# Altium footprint library ICs And Semiconductors SMD.PcbLib: 602 footprints (part 13 of 38)
Each footprint in its own frame and in the unit in brackets; x right, y up, seen from the top. Pads: shape width x height; smd on the part's side, far side on the other; paste and mask are expansions set on the pad; w line width, h text height; cw(c..) or ccw(c..) is an arc to the next point about the centre after c.
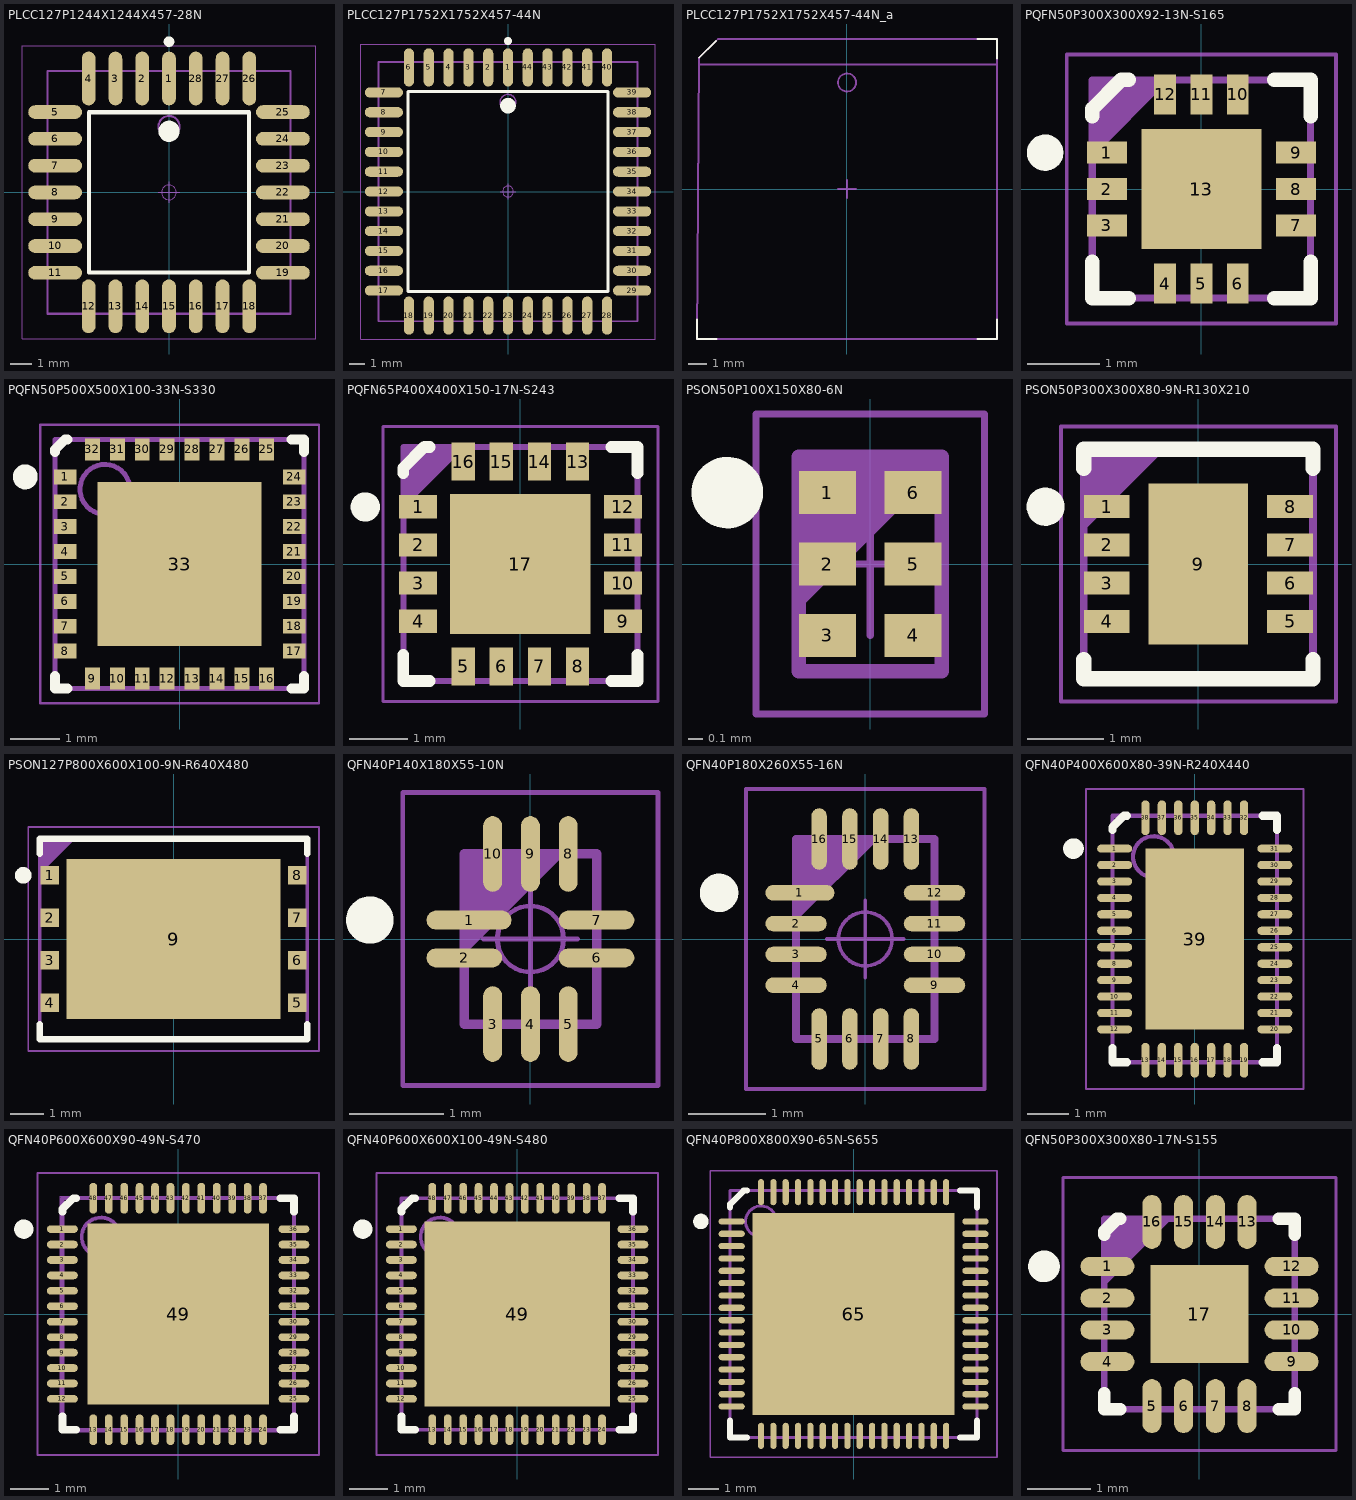
[diagram p12: the footprints below, top view; thin cyan lines are the x and y axes]

## PLCC127P1244X1244X457-28N [mm] "PLCC, 1.27mm Pitch, Square; 7 Pin X 7 Pin, 11.50mm L X 11.50mm W X 4.57mm H body, IPC Medium Density"
height 4.57
pads (28):
  oval 0.65x2.55 smd: 1(0,5.4) 2(-1.27,5.4) 3(-2.54,5.4) 4(-3.81,5.4) 12(-3.81,-5.4) 13(-2.54,-5.4) 14(-1.27,-5.4) 15(0,-5.4) 16(1.27,-5.4) 17(2.54,-5.4) 18(3.81,-5.4) 26(3.81,5.4) 27(2.54,5.4) 28(1.27,5.4)
  oval 2.55x0.65 smd: 5(-5.4,3.81) 6(-5.4,2.54) 7(-5.4,1.27) 8(-5.4,0) 9(-5.4,-1.27) 10(-5.4,-2.54) 11(-5.4,-3.81) 19(5.4,-3.81) 20(5.4,-2.54) 21(5.4,-1.27) 22(5.4,0) 23(5.4,1.27) 24(5.4,2.54) 25(5.4,3.81)
Top Overlay:
  circle w0.5: c0,2.9 r0.25
  circle w0.25: c0,7.15 r0.125
  lines w0.2: -3.8,-3.8 -3.8,3.8 3.8,3.8 3.8,-3.8 -3.8,-3.8
Mechanical 14:
  circle w0.1: c0,3.125 r0.5
  lines w0.1: -5.752,-5.752 -5.752,5.752 5.752,5.752 5.752,-5.752 -5.752,-5.752
Mechanical 15:
  circle w0.05: c0,0 r0.35
  lines w0.05: -0.5,0 0.5,0 ; 0,-0.5 0,0.5 ; -6.95,-6.95 -6.95,6.95 6.95,6.95 6.95,-6.95 -6.95,-6.95
3D body "PLCC127P1244X1244X457-28N.stp": height 4.5, standoff 0, extent -6.159,-6.157 6.16,6.162

## PLCC127P1752X1752X457-44N [mm] "PLCC, 1.27mm Pitch, Square; 44 Pin, 16.60mm L X 16.60mm W X 4.57mm H Body, IPC Medium Density"
height 4.57
pads (44):
  oval 0.65x2.45 smd: 1(0,7.95) 2(-1.27,7.95) 3(-2.54,7.95) 4(-3.81,7.95) 5(-5.08,7.95) 6(-6.35,7.95) 18(-6.35,-7.95) 19(-5.08,-7.95) 20(-3.81,-7.95) 21(-2.54,-7.95) 22(-1.27,-7.95) 23(0,-7.95) 24(1.27,-7.95) 25(2.54,-7.95) 26(3.81,-7.95) 27(5.08,-7.95) 28(6.35,-7.95) 40(6.35,7.95) 41(5.08,7.95) 42(3.81,7.95) 43(2.54,7.95) 44(1.27,7.95)
  oval 2.45x0.65 smd: 7(-7.95,6.35) 8(-7.95,5.08) 9(-7.95,3.81) 10(-7.95,2.54) 11(-7.95,1.27) 12(-7.95,0) 13(-7.95,-1.27) 14(-7.95,-2.54) 15(-7.95,-3.81) 16(-7.95,-5.08) 17(-7.95,-6.35) 29(7.95,-6.35) 30(7.95,-5.08) 31(7.95,-3.81) 32(7.95,-2.54) 33(7.95,-1.27) 34(7.95,0) 35(7.95,1.27) 36(7.95,2.54) 37(7.95,3.81) 38(7.95,5.08) 39(7.95,6.35)
Top Overlay:
  circle w0.25: c0,9.65 r0.125
  circle w0.5: c0,5.5 r0.25
  lines w0.2: -6.4,-6.4 6.4,-6.4 6.4,6.4 -6.4,6.4 -6.4,-6.4
Mechanical 14:
  circle w0.1: c0,5.725 r0.5
  lines w0.1: -8.3,-8.3 8.3,-8.3 8.3,8.3 -8.3,8.3 -8.3,-8.3
Mechanical 15:
  circle w0.05: c0,0 r0.35
  lines w0.05: -0.5,0 0.5,0 ; 0,-0.5 0,0.5 ; -9.45,-9.45 9.45,-9.45 9.45,9.45 -9.45,9.45 -9.45,-9.45
3D body "PLCC127P1752X1752X457-44N.stp": height 4.39, standoff 0, extent -8.762,-8.762 8.763,8.763

## PLCC127P1752X1752X457-44N_a [mm] "PLCC, 1.27mm Pitch, Square; 44 Pin, 16.60mm L X 16.60mm W X 4.57mm H Body, IPC Medium Density"
height 4.57
Top Overlay:
  lines w0.1: -8.3,-7.219 -8.3,-8.3 -7.219,-8.3 ; -8.188,7.261 -7.256,8.182 ; 7.219,-8.3 8.3,-8.3 8.3,-7.219 ; 7.219,8.3 8.3,8.3 8.3,7.219
Mechanical 8:
  lines w0.1: -0.5,0 0,0 ; 0,-0.5 0,0 ; 0,0.5 0,0 ; 0.5,0 0,0
Mechanical 14:
  circle w0.1: c0,5.893 r0.5
  lines w0.1: -8.191,6.893 8.3,6.893 ; -8.3,-8.3 -8.188,7.261 -7.136,8.3 8.3,8.3 8.3,-8.3 -8.3,-8.3
3D body "PLCC127P1752X1752X457-44N.stp": height 4.39, standoff 0, extent -8.762,-8.762 8.763,8.763

## PQFN50P300X300X92-13N-S165 [mm] "QFN, 0.50mm pitch,square; 12 Pin, 3mm X 3mm X 0.92mm H body (With Pullback Leads,Thermal Tab 1.65 X 1.65mm),  IPC Medium Density"
height 0.92
pads (13):
  rect 0.55x0.3 smd: 1(-1.3,0.5) 2(-1.3,0) 3(-1.3,-0.5) 7(1.3,-0.5) 8(1.3,0) 9(1.3,0.5)
  rect 0.3x0.55 smd: 4(-0.5,-1.3) 5(0,-1.3) 6(0.5,-1.3) 10(0.5,1.3) 11(0,1.3) 12(-0.5,1.3)
  rect 1.65x1.65 smd: 13(0,0)
Top Overlay:
  circle w0.25: c-2.15,0.5 r0.125
  lines w0.2: -1.5,-1 -1.5,-1.5 -1,-1.5 ; -1.5,1 -1.5,1.1 -1.1,1.5 -1,1.5 ; 1,-1.5 1.5,-1.5 1.5,-1 ; 1,1.5 1.5,1.5 1.5,1
Mechanical 14:
  lines w0.1: -1.5,0.5 -0.5,1.5 ; -1.5,0.6 -0.6,1.5 ; -1.5,0.7 -0.7,1.5 ; -1.5,0.8 -0.8,1.5 ; -1.5,0.9 -0.9,1.5 ; -1.5,1 -1,1.5 ; -1.5,1.1 -1.1,1.5 ; -1.5,1.2 -1.2,1.5 ; -1.5,1.3 -1.3,1.5 ; -1.5,1.4 -1.4,1.5 ; -1.5,-1.5 -1.5,1.5 1.5,1.5 1.5,-1.5 -1.5,-1.5
Mechanical 15:
  circle w0.05: c0,0 r0.35
  lines w0.05: -0.5,0 0.5,0 ; 0,-0.5 0,0.5 ; -1.85,-1.85 -1.85,1.85 1.85,1.85 1.85,-1.85 -1.85,-1.85
3D body "PQFN50P300X300X92-13N-S165.stp": height 0.92, standoff 0, extent -1.565,-1.565 1.565,1.565

## PQFN50P500X500X100-33N-S330 [mm] "QFN, 0.50mm pitch, Square; 32 Pin, 5.00mm L X 5.00mm W X 1.00mm H body (w/Pullback Leads, Thermal Tab 3.3 X 3.3mm),  IPC Medium Density"
height 1
pads (33):
  rect 0.45x0.3 smd: 1(-2.3,1.75) 2(-2.3,1.25) 3(-2.3,0.75) 4(-2.3,0.25) 5(-2.3,-0.25) 6(-2.3,-0.75) 7(-2.3,-1.25) 8(-2.3,-1.75) 17(2.3,-1.75) 18(2.3,-1.25) 19(2.3,-0.75) 20(2.3,-0.25) 21(2.3,0.25) 22(2.3,0.75) 23(2.3,1.25) 24(2.3,1.75)
  rect 0.3x0.45 smd: 9(-1.75,-2.3) 10(-1.25,-2.3) 11(-0.75,-2.3) 12(-0.25,-2.3) 13(0.25,-2.3) 14(0.75,-2.3) 15(1.25,-2.3) 16(1.75,-2.3) 25(1.75,2.3) 26(1.25,2.3) 27(0.75,2.3) 28(0.25,2.3) 29(-0.25,2.3) 30(-0.75,2.3) 31(-1.25,2.3) 32(-1.75,2.3)
  rect 3.3x3.3 smd: 33(0,0)
Top Overlay:
  circle w0.25: c-3.1,1.75 r0.125
  lines w0.2: -2.5,-2.25 -2.5,-2.5 -2.25,-2.5 ; -2.5,2.25 -2.5,2.3 -2.3,2.5 -2.25,2.5 ; 2.25,-2.5 2.5,-2.5 2.5,-2.25 ; 2.25,2.5 2.5,2.5 2.5,2.25
Mechanical 14:
  circle w0.1: c-1.5,1.5 r0.5
  lines w0.1: -2.5,-2.5 -2.5,2.5 2.5,2.5 2.5,-2.5 -2.5,-2.5
Mechanical 15:
  circle w0.05: c0,0 r0.35
  lines w0.05: -0.5,0 0.5,0 ; 0,-0.5 0,0.5 ; -2.8,-2.8 -2.8,2.8 2.8,2.8 2.8,-2.8 -2.8,-2.8
3D body "PQFN50P500X500X100-33N-S330.stp": height 1, standoff 0, extent -2.5,-2.5 2.5,2.5

## PQFN65P400X400X150-17N-S243 [mm] "QFN, 0.65mm Pitch, Square; 16 Pin, 4.00mm L X 4.00mm W X 1.50mm H Body (With Pullback Leads,Thermal Tab 2.43 X 2.43mm),  IPC Medium Density"
height 1.5
pads (17):
  rect 0.65x0.4 smd: 1(-1.75,0.975) 2(-1.75,0.325) 3(-1.75,-0.325) 4(-1.75,-0.975) 9(1.75,-0.975) 10(1.75,-0.325) 11(1.75,0.325) 12(1.75,0.975)
  rect 0.4x0.65 smd: 5(-0.975,-1.75) 6(-0.325,-1.75) 7(0.325,-1.75) 8(0.975,-1.75) 13(0.975,1.75) 14(0.325,1.75) 15(-0.325,1.75) 16(-0.975,1.75)
  rect 2.4x2.4 smd: 17(0,0)
Top Overlay:
  circle w0.25: c-2.65,0.975 r0.125
  lines w0.2: -2,-1.55 -2,-2 -1.55,-2 ; -2,1.55 -2,1.64 -1.64,2 -1.55,2 ; 1.55,-2 2,-2 2,-1.55 ; 1.55,2 2,2 2,1.55
Mechanical 14:
  lines w0.1: -2,1 -1,2 ; -2,1.1 -1.1,2 ; -2,1.2 -1.2,2 ; -2,1.3 -1.3,2 ; -2,1.4 -1.4,2 ; -2,1.5 -1.5,2 ; -2,1.6 -1.6,2 ; -2,1.7 -1.7,2 ; -2,1.8 -1.8,2 ; -2,1.9 -1.9,2 ; -2,-2 -2,2 2,2 2,-2 -2,-2
Mechanical 15:
  circle w0.05: c0,0 r0.35
  lines w0.05: -0.5,0 0.5,0 ; 0,-0.5 0,0.5 ; -2.35,-2.35 -2.35,2.35 2.35,2.35 2.35,-2.35 -2.35,-2.35
3D body "PQFN65P400X400X150-17N-S243.stp": height 1.45, standoff -0.05, extent -2,-2 2,2

## PSON50P100X150X80-6N [mm] "SON, 0.50mm,pitch; 6 pin,1.00mm W X 1.50mm L X 0.80mm H body (w/pullback leads),  IPC Medium Density"
height 0.8
pads (6):
  rect 0.4x0.3 smd: 1(-0.3,0.5) 2(-0.3,0) 3(-0.3,-0.5) 4(0.3,-0.5) 5(0.3,0) 6(0.3,0.5)
Top Overlay:
  circle w0.25: c-1,0.5 r0.125
Mechanical 14:
  lines w0.1: -0.5,-0.25 0.5,0.75 ; -0.5,-0.15 0.4,0.75 ; -0.5,-0.05 0.3,0.75 ; -0.5,0.05 0.2,0.75 ; -0.5,0.15 0.1,0.75 ; -0.5,0.25 0,0.75 ; -0.5,0.35 -0.1,0.75 ; -0.5,0.45 -0.2,0.75 ; -0.5,0.55 -0.3,0.75 ; -0.5,0.65 -0.4,0.75 ; 0.5,0.75 0.5,-0.75 -0.5,-0.75 -0.5,0.75 0.5,0.75
Mechanical 15:
  lines w0.05: -0.5,0 0.5,0 ; 0,-0.5 0,0.5 ; -0.8,-1.05 0.8,-1.05 0.8,1.05 -0.8,1.05 -0.8,-1.05
3D body "PSON50P100X150X80-6N.stp": height 0.8, standoff 0, extent -0.5,-0.75 0.5,0.75

## PSON50P300X300X80-9N-R130X210 [mm] "SON,  0.50mm pitch, 10 pin, 3mm X 3mm X 0.8mm H body (w/thermal tab 1.3 X 2.1mm),  IPC Medium Density"
height 0.8
pads (9):
  rect 0.6x0.3 smd: 1(-1.2,0.75) 2(-1.2,0.25) 3(-1.2,-0.25) 4(-1.2,-0.75) 5(1.2,-0.75) 6(1.2,-0.25) 7(1.2,0.25) 8(1.2,0.75)
  rect 1.3x2.1 smd: 9(0,0)
Top Overlay:
  circle w0.25: c-2,0.75 r0.125
  lines w0.2: -1.5,-1.25 -1.5,-1.5 1.5,-1.5 1.5,-1.25 ; -1.5,1.25 -1.5,1.5 1.5,1.5 1.5,1.25
Mechanical 14:
  lines w0.1: -1.5,0.5 -0.5,1.5 ; -1.5,0.6 -0.6,1.5 ; -1.5,0.7 -0.7,1.5 ; -1.5,0.8 -0.8,1.5 ; -1.5,0.9 -0.9,1.5 ; -1.5,1 -1,1.5 ; -1.5,1.1 -1.1,1.5 ; -1.5,1.2 -1.2,1.5 ; -1.5,1.3 -1.3,1.5 ; -1.5,1.4 -1.4,1.5 ; -1.5,-1.5 1.5,-1.5 1.5,1.5 -1.5,1.5 -1.5,-1.5
Mechanical 15:
  circle w0.05: c0,0 r0.35
  lines w0.05: -0.5,0 0.5,0 ; 0,-0.5 0,0.5 ; -1.8,-1.8 1.8,-1.8 1.8,1.8 -1.8,1.8 -1.8,-1.8
3D body "PSON50P300X300X80-9N-R130X210.stp": height 0.8, standoff 0, extent -1.5,-1.5 1.5,1.5

## PSON127P800X600X100-9N-R640X480 [mm] "SON,1.27mm,pitch; 8 pin,8.00mm W X 6.00mm L X 1.00mm H body (w/pullback leads,thermal tab 6.4 X 4.8mm), IPC Medium Density"
height 1
pads (9):
  rect 0.55x0.55 smd: 1(-3.7,1.905) 2(-3.7,0.635) 3(-3.7,-0.635) 4(-3.7,-1.905) 5(3.7,-1.905) 6(3.7,-0.635) 7(3.7,0.635) 8(3.7,1.905)
  rect 6.4x4.8 smd: 9(0,0)
Top Overlay:
  circle w0.25: c-4.5,1.905 r0.125
  lines w0.2: -4,-2.55 -4,-3 4,-3 4,-2.55 ; -4,2.55 -4,3 4,3 4,2.55
Top Paste:
  region: 0.33,0.33 2.53,0.33 2.53,1.73 0.33,1.73
  region: -2.53,0.33 -0.33,0.33 -0.33,1.73 -2.53,1.73
  region: 0.33,-1.73 2.53,-1.73 2.53,-0.33 0.33,-0.33
  region: -2.53,-1.73 -0.33,-1.73 -0.33,-0.33 -2.53,-0.33
Mechanical 14:
  lines w0.1: -4,2 -3,3 ; -4,2.1 -3.1,3 ; -4,2.2 -3.2,3 ; -4,2.3 -3.3,3 ; -4,2.4 -3.4,3 ; -4,2.5 -3.5,3 ; -4,2.6 -3.6,3 ; -4,2.7 -3.7,3 ; -4,2.8 -3.8,3 ; -4,2.9 -3.9,3 ; -4,-3 -4,3 4,3 4,-3 -4,-3
Mechanical 15:
  lines w0.05: -0.5,0 0.5,0 ; 0,-0.5 0,0.5 ; -4.35,-3.35 -4.35,3.35 4.35,3.35 4.35,-3.35 -4.35,-3.35
3D body "PSON127P800X600X100-9N-R640X480.stp": height 1, standoff 0, extent -4.1,-3.1 4.1,3.1

## QFN40P140X180X55-10N [mm] "QFN, 0.40mm Pitch, Rect.;10 Pin, 1.80mm L X 1.40mm W X 0.55mm H Body, IPC Medium Density"
height 0.55
pads (10):
  oval 0.9x0.2 smd: 1(-0.65,0.2)
  oval 0.8x0.2 smd: 2(-0.7,-0.2) 6(0.7,-0.2) 7(0.7,0.2)
  oval 0.2x0.8 smd: 3(-0.4,-0.9) 4(0,-0.9) 5(0.4,-0.9) 8(0.4,0.9) 9(0,0.9) 10(-0.4,0.9)
Top Overlay:
  circle w0.25: c-1.7,0.2 r0.125
Mechanical 14:
  lines w0.1: -0.7,-0.1 0.3,0.9 ; -0.7,0 0.2,0.9 ; -0.7,0.1 0.1,0.9 ; -0.7,0.2 0,0.9 ; -0.7,0.3 -0.1,0.9 ; -0.7,0.4 -0.2,0.9 ; -0.7,0.5 -0.3,0.9 ; -0.7,0.6 -0.4,0.9 ; -0.7,0.7 -0.5,0.9 ; -0.7,0.8 -0.6,0.9 ; -0.7,-0.9 -0.7,0.9 0.7,0.9 0.7,-0.9 -0.7,-0.9
Mechanical 15:
  circle w0.05: c0,0 r0.35
  lines w0.05: -0.5,0 0.5,0 ; 0,-0.5 0,0.5 ; -1.35,-1.55 -1.35,1.55 1.35,1.55 1.35,-1.55 -1.35,-1.55
3D body "QFN40P140X180X55-10N.stp": height 0.55, standoff 0, extent -0.7,-0.9 0.7,0.9

## QFN40P180X260X55-16N [mm] "QFN, 0.40mm Pitch, Rect.; 16 Pin, 2.60mm L X 1.80mm W X 0.55mm H Body, IPC Medium Density"
height 0.55
pads (16):
  oval 0.9x0.2 smd: 1(-0.85,0.6)
  oval 0.8x0.2 smd: 2(-0.9,0.2) 3(-0.9,-0.2) 4(-0.9,-0.6) 9(0.9,-0.6) 10(0.9,-0.2) 11(0.9,0.2) 12(0.9,0.6)
  oval 0.2x0.8 smd: 5(-0.6,-1.3) 6(-0.2,-1.3) 7(0.2,-1.3) 8(0.6,-1.3) 13(0.6,1.3) 14(0.2,1.3) 15(-0.2,1.3) 16(-0.6,1.3)
Top Overlay:
  circle w0.25: c-1.9,0.6 r0.125
Mechanical 14:
  lines w0.1: -0.9,0.3 0.1,1.3 ; -0.9,0.4 0,1.3 ; -0.9,0.5 -0.1,1.3 ; -0.9,0.6 -0.2,1.3 ; -0.9,0.7 -0.3,1.3 ; -0.9,0.8 -0.4,1.3 ; -0.9,0.9 -0.5,1.3 ; -0.9,1 -0.6,1.3 ; -0.9,1.1 -0.7,1.3 ; -0.9,1.2 -0.8,1.3 ; -0.9,-1.3 0.9,-1.3 0.9,1.3 -0.9,1.3 -0.9,-1.3
Mechanical 15:
  circle w0.05: c0,0 r0.35
  lines w0.05: -0.5,0 0.5,0 ; 0,-0.5 0,0.5 ; -1.55,-1.95 1.55,-1.95 1.55,1.95 -1.55,1.95 -1.55,-1.95
3D body "QFN40P180X260X55-16N.stp": height 0.55, standoff 0, extent -0.9,-1.3 0.9,1.3

## QFN40P400X600X80-39N-R240X440 [mm] "QFN, 0.40mm Pitch, Rect.; 38 Pin, 6.00mm L X 4.00mm W X 0.80mm H Body (W/Thermal Tab 2.4mm X 4.4mm), IPC Medium Density"
height 0.9
pads (39):
  oval 0.85x0.2 smd: 1(-1.95,2.2) 2(-1.95,1.8) 3(-1.95,1.4) 4(-1.95,1) 5(-1.95,0.6) 6(-1.95,0.2) 7(-1.95,-0.2) 8(-1.95,-0.6) 9(-1.95,-1) 10(-1.95,-1.4) 11(-1.95,-1.8) 12(-1.95,-2.2) 20(1.95,-2.2) 21(1.95,-1.8) 22(1.95,-1.4) 23(1.95,-1) 24(1.95,-0.6) 25(1.95,-0.2) 26(1.95,0.2) 27(1.95,0.6) 28(1.95,1) 29(1.95,1.4) 30(1.95,1.8) 31(1.95,2.2)
  oval 0.2x0.85 smd: 13(-1.2,-2.95) 14(-0.8,-2.95) 15(-0.4,-2.95) 16(0,-2.95) 17(0.4,-2.95) 18(0.8,-2.95) 19(1.2,-2.95) 32(1.2,2.95) 33(0.8,2.95) 34(0.4,2.95) 35(0,2.95) 36(-0.4,2.95) 37(-0.8,2.95) 38(-1.2,2.95)
  rect 2.4x4.4 smd: 39(0,0)
Top Overlay:
  circle w0.25: c-2.95,2.2 r0.125
  lines w0.2: -2,-2.65 -2,-3 -1.65,-3 ; -2,2.65 -2,2.72 -1.72,3 -1.65,3 ; 1.65,-3 2,-3 2,-2.65 ; 1.65,3 2,3 2,2.65
Mechanical 14:
  circle w0.1: c-1,2 r0.5
  lines w0.1: -2,-3 -2,3 2,3 2,-3 -2,-3
Mechanical 15:
  circle w0.05: c0,0 r0.35
  lines w0.05: -0.5,0 0.5,0 ; 0,-0.5 0,0.5 ; -2.65,-3.65 -2.65,3.65 2.65,3.65 2.65,-3.65 -2.65,-3.65
3D body "QFN40P400X600X80-39N-R240X440.stp": height 0.8, standoff 0, extent -2,-3 2,3

## QFN40P600X600X90-49N-S470 [mm] "QFN, 0.40mm Pitch, Square; 48 Pin, 6.00mm L X 6.00mm W X 0.90mm H body (w/thermal tab 4.7 X 4.7mm), IPC Medium Density"
height 0.9
pads (49):
  oval 0.8x0.2 smd: 1(-3,2.2) 2(-3,1.8) 3(-3,1.4) 4(-3,1) 5(-3,0.6) 6(-3,0.2) 7(-3,-0.2) 8(-3,-0.6) 9(-3,-1) 10(-3,-1.4) 11(-3,-1.8) 12(-3,-2.2) 25(3,-2.2) 26(3,-1.8) 27(3,-1.4) 28(3,-1) 29(3,-0.6) 30(3,-0.2) 31(3,0.2) 32(3,0.6) 33(3,1) 34(3,1.4) 35(3,1.8) 36(3,2.2)
  oval 0.2x0.8 smd: 13(-2.2,-3) 14(-1.8,-3) 15(-1.4,-3) 16(-1,-3) 17(-0.6,-3) 18(-0.2,-3) 19(0.2,-3) 20(0.6,-3) 21(1,-3) 22(1.4,-3) 23(1.8,-3) 24(2.2,-3) 37(2.2,3) 38(1.8,3) 39(1.4,3) 40(1,3) 41(0.6,3) 42(0.2,3) 43(-0.2,3) 44(-0.6,3) 45(-1,3) 46(-1.4,3) 47(-1.8,3) 48(-2.2,3)
  rect 4.7x4.7 smd: 49(0,0)
Top Overlay:
  circle w0.25: c-4,2.2 r0.125
  lines w0.2: -3,-2.65 -3,-3 -2.65,-3 ; -3,2.65 -3,2.72 -2.72,3 -2.65,3 ; 2.65,-3 3,-3 3,-2.65 ; 2.65,3 3,3 3,2.65
Top Paste:
  region: -1.77,-1.77 -1.77,-0.29 -0.29,-0.29 -0.29,-1.77
  region: 0.29,-1.77 0.29,-0.29 1.77,-0.29 1.77,-1.77
  region: -1.77,0.29 -1.77,1.77 -0.29,1.77 -0.29,0.29
  region: 0.29,0.29 0.29,1.77 1.77,1.77 1.77,0.29
Mechanical 14:
  circle w0.1: c-2,2 r0.5
  lines w0.1: -3,-3 -3,3 3,3 3,-3 -3,-3
Mechanical 15:
  circle w0.05: c0,0 r0.35
  lines w0.05: -0.5,0 0.5,0 ; 0,-0.5 0,0.5 ; -3.65,-3.65 -3.65,3.65 3.65,3.65 3.65,-3.65 -3.65,-3.65
Mechanical 21:
  lines w0.001: -3.05,-3.05 -3.05,3.05 3.05,3.05 3.05,-3.05 -3.05,-3.05
3D body "QFN40P600X600X90-49N-S470.stp": height 0.9, standoff 0, extent -3,-3 3,3

## QFN40P600X600X100-49N-S480 [mm] "QFN, 0.40mm Pitch, Square; 48 Pin, 6.00mm L X 6.00mm W X 1.00mm H body (w/thermal tab 4.8 X 4.8mm), IPC Medium Density"
height 1
pads (49):
  oval 0.8x0.2 smd: 1(-3,2.2) 2(-3,1.8) 3(-3,1.4) 4(-3,1) 5(-3,0.6) 6(-3,0.2) 7(-3,-0.2) 8(-3,-0.6) 9(-3,-1) 10(-3,-1.4) 11(-3,-1.8) 12(-3,-2.2) 25(3,-2.2) 26(3,-1.8) 27(3,-1.4) 28(3,-1) 29(3,-0.6) 30(3,-0.2) 31(3,0.2) 32(3,0.6) 33(3,1) 34(3,1.4) 35(3,1.8) 36(3,2.2)
  oval 0.2x0.8 smd: 13(-2.2,-3) 14(-1.8,-3) 15(-1.4,-3) 16(-1,-3) 17(-0.6,-3) 18(-0.2,-3) 19(0.2,-3) 20(0.6,-3) 21(1,-3) 22(1.4,-3) 23(1.8,-3) 24(2.2,-3) 37(2.2,3) 38(1.8,3) 39(1.4,3) 40(1,3) 41(0.6,3) 42(0.2,3) 43(-0.2,3) 44(-0.6,3) 45(-1,3) 46(-1.4,3) 47(-1.8,3) 48(-2.2,3)
  rect 4.8x4.8 smd: 49(0,0)
Top Overlay:
  circle w0.25: c-4,2.2 r0.125
  lines w0.2: -3,-2.65 -3,-3 -2.65,-3 ; -3,2.65 -3,2.72 -2.72,3 -2.65,3 ; 2.65,-3 3,-3 3,-2.65 ; 2.65,3 3,3 3,2.65
Top Paste:
  region: 0.29,0.29 0.29,1.81 1.81,1.81 1.81,0.29
  region: -1.81,0.29 -1.81,1.81 -0.29,1.81 -0.29,0.29
  region: 0.29,-1.81 0.29,-0.29 1.81,-0.29 1.81,-1.81
  region: -1.81,-1.81 -1.81,-0.29 -0.29,-0.29 -0.29,-1.81
Mechanical 14:
  circle w0.1: c-2,2 r0.5
  lines w0.1: -3,-3 3,-3 3,3 -3,3 -3,-3
Mechanical 15:
  circle w0.05: c0,0 r0.35
  lines w0.05: -0.5,0 0.5,0 ; 0,-0.5 0,0.5 ; -3.65,-3.65 3.65,-3.65 3.65,3.65 -3.65,3.65 -3.65,-3.65
3D body "QFN40P600X600X100-49N-S480.stp": height 1, standoff 0, extent -3,-3 3,3

## QFN40P800X800X90-65N-S655 [mm] "QFN, 0.40mm Pitch, Square; 64 Pin, 8.00mm L X 8.00mm W X 0.90mm H body (W/Thermal Tab 6.55mm X 6.55mm), IPC Medium Density"
height 0.9
pads (65):
  oval 0.85x0.2 smd: 1(-3.95,3) 2(-3.95,2.6) 3(-3.95,2.2) 4(-3.95,1.8) 5(-3.95,1.4) 6(-3.95,1) 7(-3.95,0.6) 8(-3.95,0.2) 9(-3.95,-0.2) 10(-3.95,-0.6) 11(-3.95,-1) 12(-3.95,-1.4) 13(-3.95,-1.8) 14(-3.95,-2.2) 15(-3.95,-2.6) 16(-3.95,-3) 33(3.95,-3) 34(3.95,-2.6) 35(3.95,-2.2) 36(3.95,-1.8) 37(3.95,-1.4) 38(3.95,-1) 39(3.95,-0.6) 40(3.95,-0.2) 41(3.95,0.2) 42(3.95,0.6) 43(3.95,1) 44(3.95,1.4) 45(3.95,1.8) 46(3.95,2.2) 47(3.95,2.6) 48(3.95,3)
  oval 0.2x0.85 smd: 17(-3,-3.95) 18(-2.6,-3.95) 19(-2.2,-3.95) 20(-1.8,-3.95) 21(-1.4,-3.95) 22(-1,-3.95) 23(-0.6,-3.95) 24(-0.2,-3.95) 25(0.2,-3.95) 26(0.6,-3.95) 27(1,-3.95) 28(1.4,-3.95) 29(1.8,-3.95) 30(2.2,-3.95) 31(2.6,-3.95) 32(3,-3.95) 49(3,3.95) 50(2.6,3.95) 51(2.2,3.95) 52(1.8,3.95) 53(1.4,3.95) 54(1,3.95) 55(0.6,3.95) 56(0.2,3.95) 57(-0.2,3.95) 58(-0.6,3.95) 59(-1,3.95) 60(-1.4,3.95) 61(-1.8,3.95) 62(-2.2,3.95) 63(-2.6,3.95) 64(-3,3.95)
  rect 6.55x6.55 smd: 65(0,0)
Top Overlay:
  circle w0.25: c-4.95,3 r0.125
  lines w0.2: -4,-3.45 -4,-4 -3.45,-4 ; -4,3.45 -4,3.56 -3.56,4 -3.45,4 ; 3.45,-4 4,-4 4,-3.45 ; 3.45,4 4,4 4,3.45
Top Paste:
  region: -2.67,-2.67 -2.67,-1.29 -1.29,-1.29 -1.29,-2.67
  region: -0.69,-2.67 -0.69,-1.29 0.69,-1.29 0.69,-2.67
  region: 1.29,-2.67 1.29,-1.29 2.67,-1.29 2.67,-2.67
  region: -2.67,-0.69 -2.67,0.69 -1.29,0.69 -1.29,-0.69
  region: -0.69,-0.69 -0.69,0.69 0.69,0.69 0.69,-0.69
  region: 1.29,-0.69 1.29,0.69 2.67,0.69 2.67,-0.69
  region: -2.67,1.29 -2.67,2.67 -1.29,2.67 -1.29,1.29
  region: -0.69,1.29 -0.69,2.67 0.69,2.67 0.69,1.29
  region: 1.29,1.29 1.29,2.67 2.67,2.67 2.67,1.29
Mechanical 14:
  circle w0.1: c-3,3 r0.5
  lines w0.1: -4,-4 -4,4 4,4 4,-4 -4,-4
Mechanical 15:
  circle w0.05: c0,0 r0.35
  lines w0.05: -0.5,0 0.5,0 ; 0,-0.5 0,0.5 ; -4.65,-4.65 -4.65,4.65 4.65,4.65 4.65,-4.65 -4.65,-4.65
3D body "QFN40P800X800X90-65N-S655.stp": height 0.9, standoff 0, extent -4,-4 4,4

## QFN50P300X300X80-17N-S155 [mm] "QFN,0.50mm pitch,square; 4 pin X 4 pin, 3mm X 3mm X 0.80mm H body (w/thermal tab 1.55 X 1.55mm),  IPC Medium Density"
height 1
pads (17):
  oval 0.85x0.3 smd: 1(-1.45,0.75) 2(-1.45,0.25) 3(-1.45,-0.25) 4(-1.45,-0.75) 9(1.45,-0.75) 10(1.45,-0.25) 11(1.45,0.25) 12(1.45,0.75)
  oval 0.3x0.85 smd: 5(-0.75,-1.45) 6(-0.25,-1.45) 7(0.25,-1.45) 8(0.75,-1.45) 13(0.75,1.45) 14(0.25,1.45) 15(-0.25,1.45) 16(-0.75,1.45)
  rect 1.55x1.55 smd: 17(0,0)
Top Overlay:
  circle w0.25: c-2.45,0.75 r0.125
  lines w0.2: -1.5,-1.25 -1.5,-1.5 -1.25,-1.5 ; -1.5,1.25 -1.5,1.3 -1.3,1.5 -1.25,1.5 ; 1.25,-1.5 1.5,-1.5 1.5,-1.25 ; 1.25,1.5 1.5,1.5 1.5,1.25
Mechanical 14:
  lines w0.1: -1.5,0.5 -0.5,1.5 ; -1.5,0.6 -0.6,1.5 ; -1.5,0.7 -0.7,1.5 ; -1.5,0.8 -0.8,1.5 ; -1.5,0.9 -0.9,1.5 ; -1.5,1 -1,1.5 ; -1.5,1.1 -1.1,1.5 ; -1.5,1.2 -1.2,1.5 ; -1.5,1.3 -1.3,1.5 ; -1.5,1.4 -1.4,1.5 ; -1.5,-1.5 -1.5,1.5 1.5,1.5 1.5,-1.5 -1.5,-1.5
Mechanical 15:
  lines w0.05: -0.5,0 0.5,0 ; 0,-0.5 0,0.5 ; -2.15,-2.15 -2.15,2.15 2.15,2.15 2.15,-2.15 -2.15,-2.15
3D body "QFN50P300X300X80-17N-S155.stp": height 0.8, standoff 0, extent -1.575,-1.575 1.575,1.575